# Altium footprint library Un_interruptable_power_supply_180534N_PCB.PcbLib: 15 footprints
Each footprint in its own frame and in the unit in brackets; x right, y up, seen from the top. Pads: shape width x height; smd on the part's side, far side on the other; paste and mask are expansions set on the pad; w line width, h text height; cw(c..) or ccw(c..) is an arc to the next point about the centre after c.
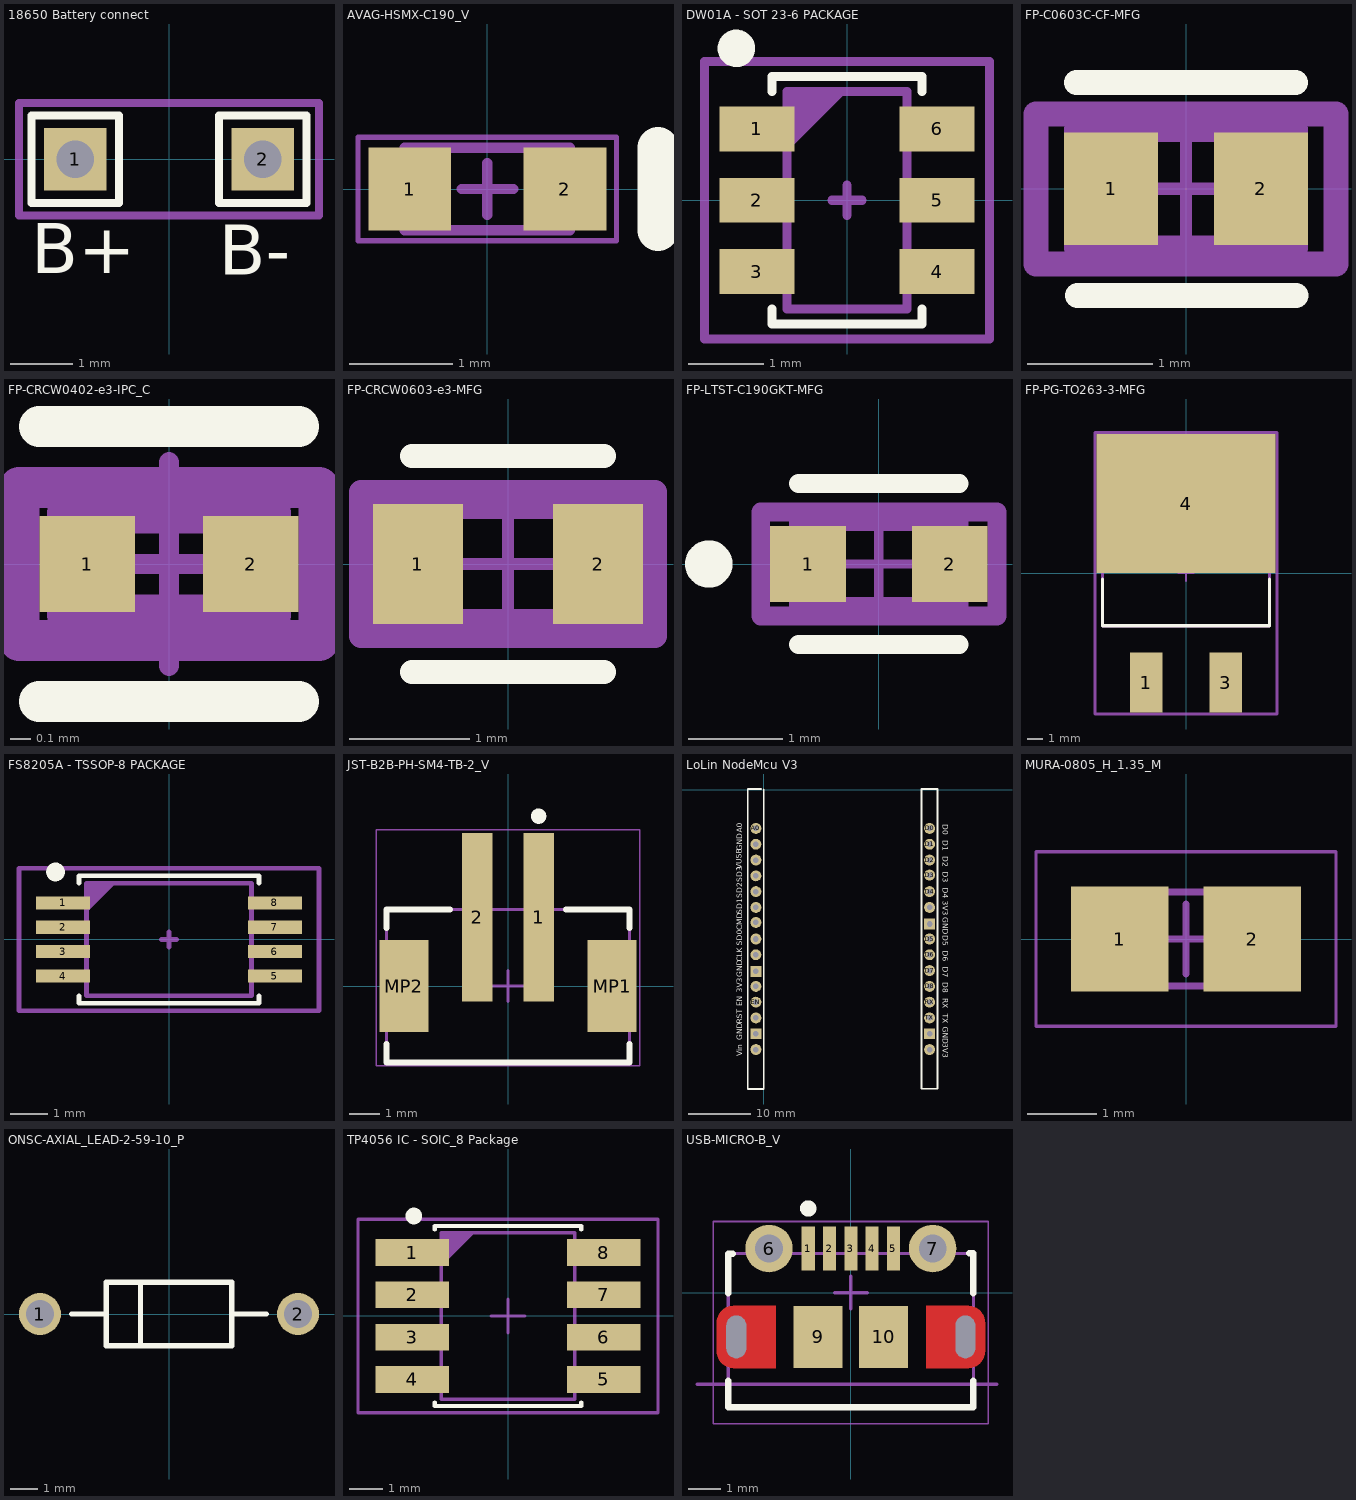
[diagram p0: the footprints below, top view; thin cyan lines are the x and y axes]

## 18650 Battery connect [mm]
pads (2):
  rect 1x1 hole 0.6: 1(-1.5,0) 2(1.5,0)
Top Overlay:
  lines w0.125: -2.2,-0.7 -0.8,-0.7 -0.8,0.7 -2.2,0.7 -2.2,-0.7 ; 0.8,-0.7 2.2,-0.7 2.2,0.7 0.8,0.7 0.8,-0.7
  text "B-" at 0.8,-1.85 h0.8
  text "B+" at -2.2,-1.825 h0.8
Top Courtyard:
  lines w0.125: -2.4,-0.9 -2.4,0.9 2.4,0.9 2.4,-0.9 -2.4,-0.9

## AVAG-HSMX-C190_V [mm]
pads (2):
  rect 0.8x0.8 smd: 1(-0.75,0) 2(0.75,0)
Top Overlay:
  lines w0.4: 1.65,-0.4 1.65,0.4
Top 3D Body:
  lines w0.1: -0.8,-0.4 0.8,-0.4 0.8,0.4 -0.8,0.4 -0.8,-0.4
Top Courtyard:
  lines w0.05: -1.25,-0.5 -1.25,0.5 1.25,0.5 1.25,-0.5 -1.25,-0.5
  lines w0.1: -0.25,0 0.25,0 ; 0,-0.25 0,0.25
3D body: height 0.4, standoff 0, extent -0.8,-0.4 0.8,0.4
3D body: height 0.9, standoff 0.4, extent -0.55,-0.4 0.55,0.4

## DW01A - SOT 23-6 PACKAGE [mm]
pads (6):
  rect 1x0.6 smd: 1(-1.2,0.95) 2(-1.2,0) 3(-1.2,-0.95) 4(1.2,-0.95) 5(1.2,0) 6(1.2,0.95)
Top Overlay:
  circle w0.25: c-1.475,2.025 r0.125
  lines w0.125: -1,-1.45 -1,-1.65 1,-1.65 1,-1.45 ; -1,1.45 -1,1.65 1,1.65 1,1.45
Top Assembly:
  region: -0.8,1.45 -0.8,0.65 0,1.45
  lines w0.125: -0.8,-1.45 -0.8,1.45 0.8,1.45 0.8,-1.45 -0.8,-1.45
Top Courtyard:
  lines w0.125: -0.2,0 0.2,0 ; 0,-0.2 0,0.2 ; -1.9,-1.85 -1.9,1.85 1.9,1.85 1.9,-1.85 -1.9,-1.85
3D body "sot-23-6.stp": height 1.12, standoff 0.01, extent -1.422,-1.46 1.423,1.461

## FP-C0603C-CF-MFG [mm]
pads (2):
  rect 0.75x0.9 smd paste+0 mask+0: 1(-0.6,0) 2(0.6,0)
Top Overlay:
  lines w0.2: -0.875,0.85 0.875,0.85 ; -0.87,-0.853 0.88,-0.853
Top Component Center:
  lines w0.1: -0.5,0 0.5,0 ; 0,-0.5 0,0.5
Top Assembly:
  lines w0.2: -1.2,-0.6 -1.2,0.6 1.2,0.6 1.2,-0.6 -1.2,-0.6
  text ".Designator" at 0,0.188 h1
Top 3D Body:
  lines w0.2: -0.875,-0.475 -0.875,0.475 0.875,0.475 0.875,-0.475 -0.875,-0.475
Top Courtyard:
  lines w0.2: -1.2,-0.6 -1.2,0.6 1.2,0.6 1.2,-0.6 -1.2,-0.6
3D body "Cap_KEMET_C0603C272M5JACTU_eec.STEP": height 0.25, standoff 0, extent -1.2,-0.6 1.2,0.6

## FP-CRCW0402-e3-IPC_C [mm]
pads (2):
  rect 0.468x0.472 smd paste+0 mask+0: 1(-0.402,0) 2(0.402,0)
Top Overlay:
  lines w0.2: -0.636,-0.675 0.636,-0.675 ; -0.636,0.675 0.636,0.675
Top Component Center:
  lines w0.1: -0.5,0 0.5,0 ; 0,-0.5 0,0.5
Top Assembly:
  lines w0.2: -0.736,-0.375 -0.736,0.375 0.736,0.375 0.736,-0.375 -0.736,-0.375
  text ".Designator" at 0,0.188 h1
Top 3D Body:
  lines w0.2: -0.5,-0.25 -0.5,0.25 0.5,0.25 0.5,-0.25 -0.5,-0.25
Top Courtyard:
  lines w0.2: -0.736,-0.375 -0.736,0.375 0.736,0.375 0.736,-0.375 -0.736,-0.375
3D body "Res_Vishay_CRCW04021K00FKED_eec.STEP": height 0.25, standoff 0, extent -0.736,-0.375 0.736,0.375

## FP-CRCW0603-e3-MFG [mm]
pads (2):
  rect 0.75x1 smd paste+0 mask+0: 1(-0.75,0) 2(0.75,0)
Top Overlay:
  lines w0.2: -0.8,-0.9 0.8,-0.9 ; -0.8,0.9 0.8,0.9
Top Component Center:
  lines w0.1: -0.5,0 0.5,0 ; 0,-0.5 0,0.5
Top Assembly:
  lines w0.2: -1.225,-0.6 -1.225,0.6 1.225,0.6 1.225,-0.6 -1.225,-0.6
  text ".Designator" at 0,0.188 h1
Top 3D Body:
  lines w0.2: -0.825,-0.475 -0.825,0.475 0.825,0.475 0.825,-0.475 -0.825,-0.475
Top Courtyard:
  lines w0.2: -1.225,-0.6 -1.225,0.6 1.225,0.6 1.225,-0.6 -1.225,-0.6
3D body "Res_Vishay_CRCW06033M90FKEC_eec.STEP": height 0.25, standoff 0, extent -1.225,-0.6 1.225,0.6

## FP-LTST-C190GKT-MFG [mm]
pads (2):
  rect 0.8x0.8 smd paste+0 mask+0: 1(-0.75,0) 2(0.75,0)
Top Overlay:
  circle w0.25: c-1.8,0 r0.125
  lines w0.2: -0.85,-0.85 0.85,-0.85 ; -0.85,0.85 0.85,0.85
Top Component Center:
  lines w0.1: -0.5,0 0.5,0 ; 0,-0.5 0,0.5
Top Assembly:
  lines w0.2: -1.25,-0.55 -1.25,0.55 1.25,0.55 1.25,-0.55 -1.25,-0.55
  text ".Designator" at 0,-0.001 h1
Top 3D Body:
  lines w0.2: -0.85,-0.45 -0.85,0.45 0.85,0.45 0.85,-0.45 -0.85,-0.45
Top Courtyard:
  lines w0.2: -1.25,-0.55 -1.25,0.55 1.25,0.55 1.25,-0.55 -1.25,-0.55
3D body "Diode_Lite-On_LTST-C190GKT_eec.STEP": height 0.25, standoff 0, extent -1.25,-0.55 1.25,0.55

## FP-PG-TO263-3-MFG [mm]
pads (3):
  rect 2.08x3.81 smd paste+0 mask+0: 1(-2.54,-6.985) 3(2.54,-6.985)
  rect 11.43x8.89 smd paste+0 mask+0: 4(0,4.445)
Top Overlay:
  lines w0.2: -5.335,-0.375 -5.335,-3.36 5.335,-3.36 5.335,-0.375
Top Component Center:
  lines w0.1: -0.5,0 0.5,0 ; 0,-0.5 0,0.5
Top Assembly:
  lines w0.2: -5.815,-8.99 -5.815,8.99 5.815,8.99 5.815,-8.99 -5.815,-8.99
  text ".Designator" at 0,-0.001 h1
Top 3D Body:
  lines w0.2: -5.335,-3.36 -5.335,6.29 5.335,6.29 5.335,-3.36 -5.335,-3.36
Top Courtyard:
  lines w0.2: -5.815,-8.99 -5.815,8.99 5.815,8.99 5.815,-8.99 -5.815,-8.99
3D body "Trans_Infineon_IRF2805STRLPBF_eec.STEP": height 0.25, standoff 0, extent -5.815,-8.99 5.815,8.99

## FS8205A - TSSOP-8 PACKAGE [mm]
pads (8):
  rect 1.45x0.35 smd: 1(-2.825,0.975) 2(-2.825,0.325) 3(-2.825,-0.325) 4(-2.825,-0.975) 5(2.825,-0.975) 6(2.825,-0.325) 7(2.825,0.325) 8(2.825,0.975)
Top Overlay:
  circle w0.25: c-3.025,1.8 r0.125
  lines w0.125: -2.4,-1.5 -2.4,-1.7 2.4,-1.7 2.4,-1.5 ; -2.4,1.5 -2.4,1.7 2.4,1.7 2.4,1.5
Top Assembly:
  region: -2.2,1.5 -2.2,0.725 -1.425,1.5
  lines w0.125: -2.2,-1.5 2.2,-1.5 2.2,1.5 -2.2,1.5 -2.2,-1.5
Top Courtyard:
  lines w0.125: -0.2,0 0.2,0 ; 0,-0.2 0,0.2 ; -4,-1.9 4,-1.9 4,1.9 -4,1.9 -4,-1.9
3D body "tssop8_model.STEP": height 1.06, standoff -0.04, extent -3.197,-1.513 3.202,1.487

## JST-B2B-PH-SM4-TB-2_V [mm]
pads (4):
  rect 1x5.5 smd: 1(1,2.25) 2(-1,2.25)
  rect 1.6x3 smd: MP1(3.4,0) MP2(-3.4,0)
Top Overlay:
  circle w0.25: c1,5.55 r0.125
  lines w0.2: -3.975,-1.9 -3.975,-2.5 3.975,-2.5 3.975,-1.9 ; -3.975,1.9 -3.975,2.5 -1.9,2.5 ; 1.9,2.5 3.95,2.5 ; 3.975,1.9 3.975,2.5
Top 3D Body:
  lines w0.1: -1.25,2.5 -1.25,4.5 -0.75,4.5 -0.75,2.5 ; 0.75,2.5 0.75,4.5 1.25,4.5 1.25,2.5 ; -3.975,-2.5 -0.325,-2.5 0.325,-2.5 3.975,-2.5 3.975,-1.1 3.925,-1.1 3.925,1.1 3.975,1.1 3.975,2.5 -3.975,2.5 -3.975,1.1 -3.925,1.1 -3.925,-1.1 -3.975,-1.1 -3.975,-2.5
Top Courtyard:
  lines w0.05: -4.3,-2.6 -4.3,5.1 4.3,5.1 4.3,-2.6 -4.3,-2.6
  lines w0.1: -0.5,0 0.5,0 ; 0,-0.5 0,0.5
3D body: height 6.6, standoff 0, extent -3.974,-0.049 3.974,2.499
3D body: height 6.6, standoff 0, extent -3.974,-2.499 -0.326,-0.851
3D body: height 6.6, standoff 0, extent 0.326,-2.499 3.974,-0.851
3D body: height 5.22, standoff 2, extent -1.249,-0.849 -0.751,-0.351
3D body: height 4.7, standoff 0, extent -3.075,-0.85 -2.3,-0.049
3D body: height 4.7, standoff 0, extent 2.3,-0.85 3.075,-0.05
3D body: height 5.22, standoff 2, extent 0.751,-0.849 1.249,-0.351
3D body: height 4, standoff 0, extent -3.324,-1.099 -3.076,1.099
3D body: height 0.25, standoff 0, extent -3.924,-1.099 -3.326,1.099
3D body: height 2, standoff 0, extent -2.301,-0.05 2.301,1.801
3D body: height 1.75, standoff 0, extent -0.325,-2.5 0.326,-1.7
3D body: height 2.35, standoff 0, extent -2.299,-1.699 2.299,-0.051
3D body: height 0.25, standoff 0, extent 3.326,-1.099 3.924,1.099
3D body: height 0.5, standoff 0, extent -1.249,2.501 -0.751,4.499
3D body: height 0.5, standoff 0, extent 0.751,2.501 1.249,4.499
3D body: height 4, standoff 0, extent 3.076,-1.099 3.324,1.099

## LoLin NodeMcu V3 [mil]
pads (30):
  round 69 hole 35: 3V3(-49,-1246) 3V3(1051,-1646) 3V3(1051,-746) A0(-49,-246) CLK(-49,-1046) CMD(-49,-841) D0(1051,-246) D1(1051,-346) D2(1051,-446) D3(1051,-541) D4(1051,-646) D5(1051,-946) D6(1051,-1046) D7(1051,-1146) D8(1051,-1246) EN(-49,-1346) GND(-49,-346) RST(-49,-1446) RX(1051,-1346) SD0(-49,-946) SD1(-49,-746) SD2(-49,-646) SD3(-49,-546) TX(1051,-1446) VIN(-49,-1646) VUSB(-49,-446)
  rect 69x69 hole 35: GND(-49,-1546) GND(-49,-1151) GND(1051,-1546) GND(1051,-851)
Top Overlay:
  lines w10: -14,4 -100,4 -100,-80 -100,-1810 -100,-1896 1,-1896 1,2.78 ; 1100,-1895 1000,-1895 1000,4 1100,4 ; 1101,-1895 1101,-1806 1101,-86 1101,4
  text "CLK" at -124,-1090 h60
  text "SD0" at -124,-989.57 h60
  text "SD1" at -124,-788.71 h60
  text "SD2" at -124,-688.29 h60
  text "SD3" at -124,-587.86 h60
  text "VUSB" at -125,-505 h60
  text "GND" at -124,-387 h60
  text "A0" at -124,-273 h60
  text "D5" at 1121,-921 h60
  text "GND" at 1121,-807 h60
  text "3V3" at 1121,-705.01 h60
  text "D4" at 1121,-620 h60
  text "D3" at 1121,-521.58 h60
  text "D2" at 1121,-421.58 h60
  text "D1" at 1121,-321.35 h60
  text "D0" at 1121,-220 h60
  text "CMD" at -124,-889.14 h60
  text "D6" at 1121,-1020.12 h60
  text "3V3" at 1121,-1606 h60
  text "GND" at 1121,-1502.2 h60
  text "TX" at 1121,-1419 h60
  text "RX" at 1121,-1320.06 h60
  text "D8" at 1121,-1221.11 h60
  text "D7" at 1121,-1121.23 h60
  text "Vin" at -124,-1687 h60
  text "GND" at -124,-1587 h60
  text "RST" at -124,-1484 h60
  text "EN" at -124,-1372 h60
  text "3V3" at -124,-1285 h60
  text "GND" at -124,-1188 h60
3D body "Lolin NodeMCU ESP8266 V3.STEP": height 516.1, standoff -1.22, extent -120.08,-2164.01 1120.08,197.4

## MURA-0805_H_1.35_M [mm]
pads (2):
  rect 1.4x1.5 smd: 1(-0.95,0) 2(0.95,0)
Top 3D Body:
  lines w0.1: -1.05,-0.675 -1.05,0.675 1.05,0.675 1.05,-0.675 -1.05,-0.675
Top Courtyard:
  lines w0.05: -2.15,-1.25 -2.15,1.25 2.15,1.25 2.15,-1.25 -2.15,-1.25
  lines w0.1: -0.5,0 0.5,0 ; 0,-0.5 0,0.5
3D body: height 1.35, standoff 0, extent -0.6,-0.675 0.6,0.675
3D body: height 1.35, standoff 0, extent -1.05,-0.675 -0.6,0.675
3D body: height 1.35, standoff 0, extent 0.6,-0.675 1.05,0.675

## ONSC-AXIAL_LEAD-2-59-10_P [mm]
pads (2):
  round 1.55 hole 1.05: 1(-4.77,0) 2(4.77,0)
Top Overlay:
  lines w0.2: -3.595,0 -2.325,0 ; -1.055,-1.175 -1.055,1.175 ; 2.325,0 3.595,0 ; -2.325,-1.175 -2.325,1.175 2.325,1.175 2.325,-1.175 -2.325,-1.175

## TP4056 IC - SOIC_8 Package [mm]
pads (8):
  rect 2.2x0.8 smd: 1(-2.87,1.905) 2(-2.87,0.635) 3(-2.87,-0.635) 4(-2.87,-1.905) 5(2.87,-1.905) 6(2.87,-0.635) 7(2.87,0.635) 8(2.87,1.905)
Top Overlay:
  circle w0.25: c-2.825,3 r0.125
  lines w0.125: -2.2,-2.6 -2.2,-2.7 2.2,-2.7 2.2,-2.6 ; -2.2,2.6 -2.2,2.7 2.2,2.7 2.2,2.6
Top Assembly:
  region: -2,2.5 -2,1.5 -1,2.5
  lines w0.1: -2,-2.5 -2,2.5 2,2.5 2,-2.5 -2,-2.5
Top Courtyard:
  lines w0.1: -0.5,0 0.5,0 ; 0,-0.5 0,0.5 ; -4.5,-2.9 -4.5,2.9 4.5,2.9 4.5,-2.9 -4.5,-2.9
3D body "8SIOC.stp": height 1.95, standoff 0, extent -3.099,-2.502 3.099,2.502

## USB-MICRO-B_V [mm]
pads (11):
  rect 0.4x1.35 smd: 1(-1.3,1.35) 2(-0.65,1.35) 3(0,1.35) 4(0.65,1.35) 5(1.3,1.35)
  round 1.45 hole 0.85: 6(-2.5,1.35) 7(2.5,1.35)
  rrect50% 0x0 hole 0.6 slot 1.3 at 90 deg: 8(-3.5,-1.35) 11(3.5,-1.35)
  rect 1.5x1.9 smd: 9(-1,-1.35) 10(1,-1.35)
Top Layer:
  circle w0.5: c-3.6,-1.8 r0.25
  circle w0.5: c-3.6,-0.9 r0.25
  circle w0.5: c3.6,-1.8 r0.25
  circle w0.5: c3.6,-0.9 r0.25
  region: -3.6,-1.8 -3.6,-0.9 -4.1,-0.9 -4.1,-1.8
  region: 3.6,-0.9 3.6,-1.8 4.1,-1.8 4.1,-0.9
  region: 2.3,-0.4 2.3,-2.3 3.6,-2.3 3.6,-0.4
  region: -2.3,-2.3 -2.3,-0.4 -3.6,-0.4 -3.6,-2.3
Top Overlay:
  circle w0.25: c-1.3,2.575 r0.125
  lines w0.2: -3.745,-2.688 -3.745,-3.5 3.745,-3.5 3.745,-2.688 ; -3.745,-0.012 -3.745,1.195 -3.614,1.195 ; 3.615,1.2 3.745,1.2 3.745,-0.012
Mechanical 1:
  lines w0.1: -4.7,-2.8 4.465,-2.8
  text "PCB EDGE" at -7.2,-2.9 h0.3
Top 3D Body:
  lines w0.1: -3.75,1.2 3.745,1.2 3.745,-3.5 -3.745,-3.5 -3.745,1.195
Top Courtyard:
  lines w0.05: -4.2,-4 4.2,-4 4.2,2.175 -4.2,2.175 -4.2,-4
  lines w0.1: -0.5,0 0.5,0 ; 0,-0.5 0,0.5
3D body "1050170001.stp": height 2.67, standoff -0.63, extent -4.1,-3.9 4.1,1.5